# Altium footprint library SMotlaq-PCB_lib.PcbLib: 186 footprints (part 11 of 12)
Each footprint in its own frame and in the unit in brackets; x right, y up, seen from the top. Pads: shape width x height; smd on the part's side, far side on the other; paste and mask are expansions set on the pad; w line width, h text height; cw(c..) or ccw(c..) is an arc to the next point about the centre after c.
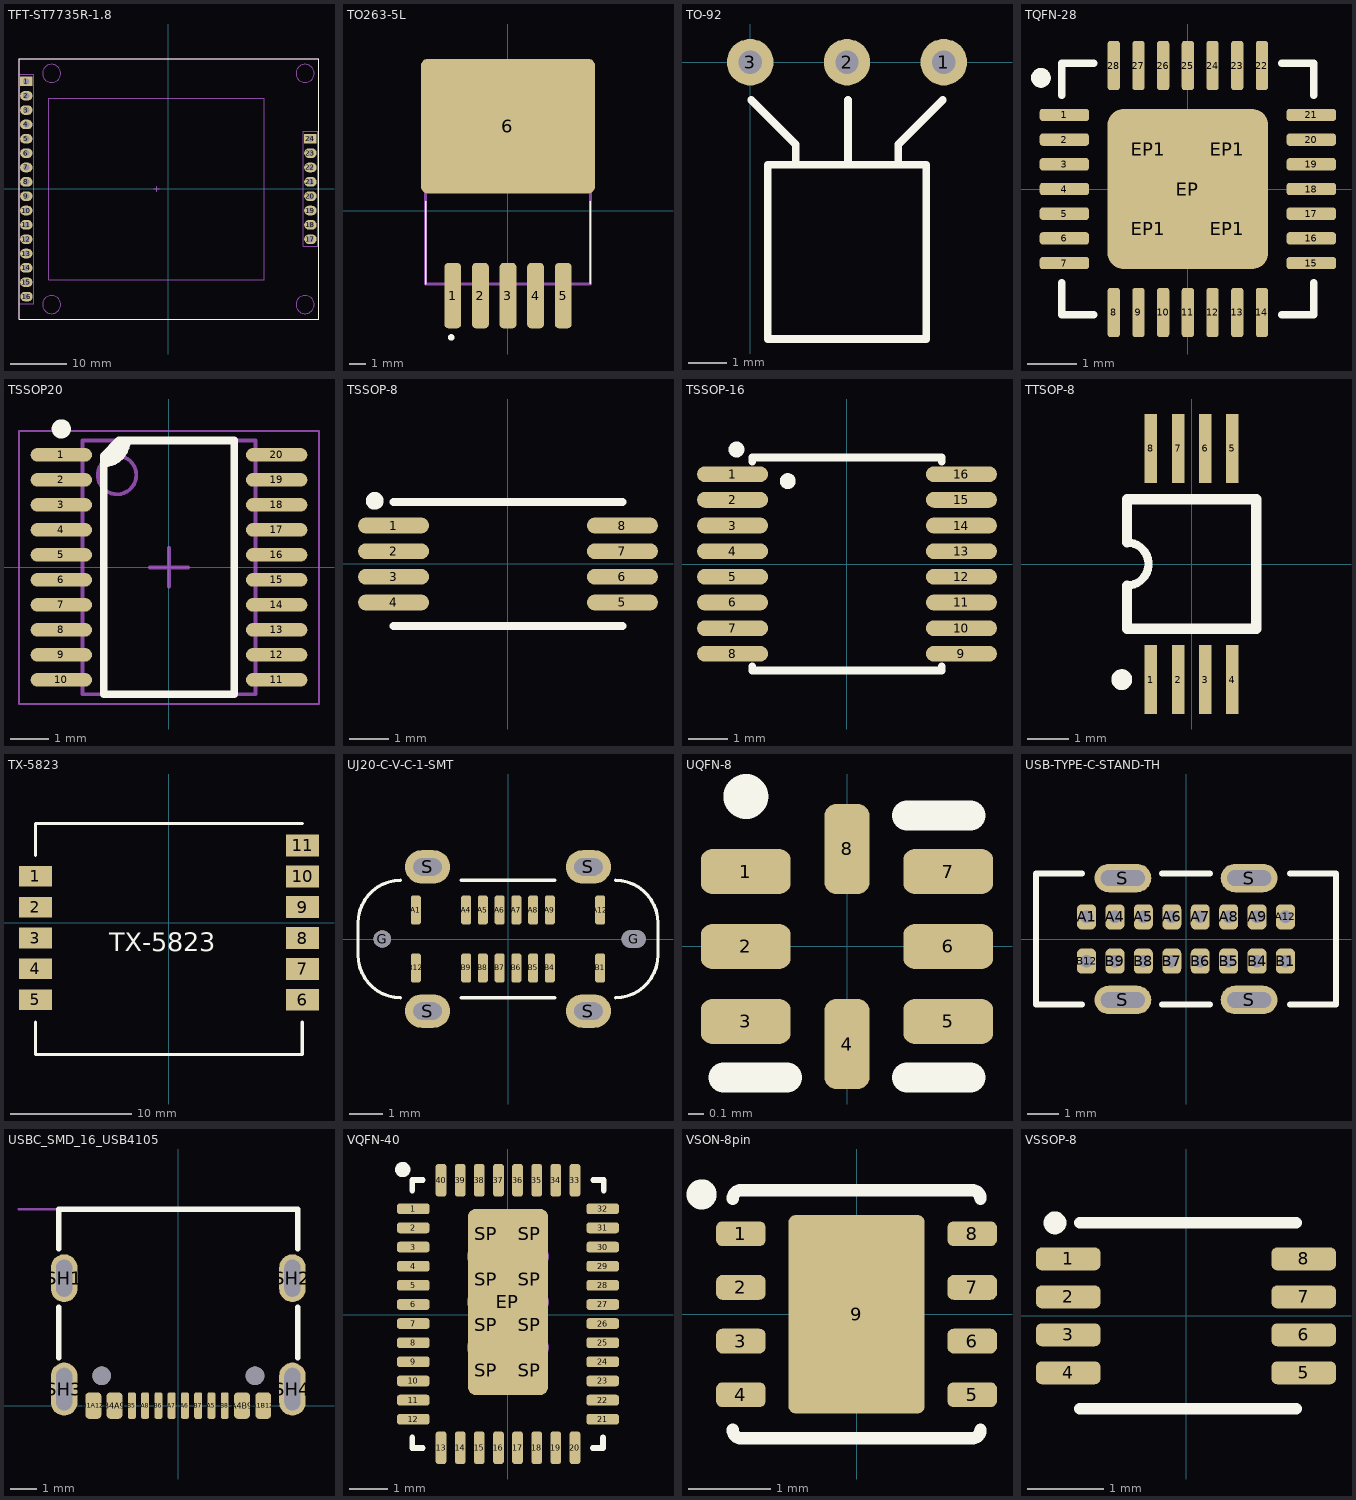
[diagram p10: the footprints below, top view; thin cyan lines are the x and y axes]

## TFT-ST7735R-1.8 [mm]
pads (24):
  rect 2.2x1.7 hole 1.1 paste-2539.97 mask+0: 1(-25.15,19.05) 24(25.15,8.89)
  oval 2.2x1.7 hole 1.1 paste-2539.97 mask+0: 2(-25.15,16.51) 3(-25.15,13.97) 4(-25.15,11.43) 5(-25.15,8.89) 6(-25.15,6.35) 7(-25.15,3.81) 8(-25.15,1.27) 9(-25.15,-1.27) 10(-25.15,-3.81) 11(-25.15,-6.35) 12(-25.15,-8.89) 13(-25.15,-11.43) 14(-25.15,-13.97) 15(-25.15,-16.51) 16(-25.117,-19.05) 17(25.15,-8.89) 18(25.15,-6.35) 19(25.15,-3.81) 20(25.15,-1.27) 21(25.15,1.27) 22(25.15,3.81) 23(25.15,6.35)
Top Overlay:
  lines w0.2: -26.45,-23.1 26.671,-23.1 26.671,23.1 -26.45,23.1 -26.45,-23.1
Mechanical 13:
  lines w0.2: -26.45,-20.35 -23.85,-20.35 -23.85,20.35 -26.45,20.35 -26.45,-20.35 ; 23.85,-10.16 26.45,-10.16 26.45,10.19 23.85,10.19 23.85,-10.16
Mechanical 15:
  circle w0.2: c-20.671,20.467 r1.6
  circle w0.2: c-20.671,-20.467 r1.6
  circle w0.2: c24.202,20.467 r1.6
  circle w0.2: c24.202,-20.467 r1.6
  lines w0.1: -2.591,0 -1.591,0 ; -2.091,-0.5 -2.091,0.5
  lines w0.2: -26.45,-23.1 -26.45,23.1 26.671,23.1 26.671,-23.1 -26.45,-23.1 ; -21.166,-16.053 -21.166,16.053 16.984,16.053 16.984,-16.053 -21.166,-16.053
Mechanical 16:
  lines w0.1: -2.591,0 -1.591,0 ; -2.091,-0.5 -2.091,0.5
3D body "1.8 LCD.stp": height 24.02, standoff 16.6, extent -26.409,-22.518 27.109,22.618
3D body "zl262-8s_p2-54_l20-8_w2-54_h8-5.stp": height 17, standoff 5.5, extent 23.86,-10.425 26.4,10.395
3D body "Header, Male, 2.54mm, 1x8.STEP": height 22.5, standoff 10.96, extent 23.86,-10.195 26.4,10.125
3D body "Header, Male, 2.54mm, 1x16.STEP": height 22.5, standoff 10.96, extent -26.42,-20.315 -23.88,20.325
3D body "Header Female 1x16.STEP": height 17.09, standoff 5.22, extent -26.387,-20.565 -23.912,20.225
3D body "Header Female 1x16.STEP": height 8.59, standoff -3.28, extent -26.387,-20.565 -23.912,20.225
3D body "zl262-8s_p2-54_l20-8_w2-54_h8-5.stp": height 8.5, standoff -3, extent 23.86,-10.425 26.4,10.395

## TO263-5L [mm]
pads (6):
  rrect50% 1.041x4.039 smd: 1(-3.404,-5.226) 2(-1.702,-5.226) 3(0,-5.226) 4(1.702,-5.226) 5(3.404,-5.226)
  rrect10% 10.744x8.306 smd paste-2539.97: 6(0,5.226)
Top Overlay:
  lines w0.1: -5.08,-4.509 -5.08,0.6 ; 5.08,-4.5 5.08,0.6
  lines w0.2: -3.6,-7.8 ccw(c-3.5,-7.8) -3.4,-7.8 ccw(c-3.5,-7.8) -3.6,-7.8
Top Paste:
  region: -4.5,2.426 -4.5,8.026 -4.5,8.072 -4.488,8.163 -4.464,8.251 -4.429,8.336 -4.383,8.416 -4.327,8.489 -4.263,8.553 -4.19,8.609 -4.11,8.655 -4.025,8.69 -3.937,8.714 -3.846,8.726 -3.8,8.726 3.8,8.726 3.846,8.726 3.937,8.714 4.025,8.69 4.11,8.655 4.19,8.609 4.263,8.553 4.327,8.489 4.383,8.416 4.429,8.336 4.464,8.251 4.488,8.163 4.5,8.072 4.5,8.026 4.5,2.426 4.5,2.38 4.488,2.289 4.464,2.201 4.429,2.116 4.383,2.036 4.327,1.963 4.263,1.899 4.19,1.843 4.11,1.797 4.025,1.762 3.937,1.738 3.846,1.726 3.8,1.726 -3.8,1.726 -3.846,1.726 -3.937,1.738 -4.025,1.762 -4.11,1.797 -4.19,1.843 -4.263,1.899 -4.327,1.963 -4.383,2.036 -4.429,2.116 -4.464,2.201 -4.488,2.289 -4.5,2.38
Mechanical 13:
  lines w0.2: -5.08,-4.509 5.08,-4.509 5.08,4.509 -5.08,4.509 -5.08,-4.509
3D body "User Library-MIC29302WU.step": height 4.45, standoff -0.1, extent -5.15,-6.476 5.15,8.752

## TO-92 [mm]
pads (3):
  round 1.2 hole 0.6: 1(5,0) 2(2.5,0) 3(0,0)
Top Overlay:
  lines w0.2: 0.025,-0.975 1.175,-2.125 1.175,-2.65 ; 2.525,-2.65 2.525,-0.975 ; 3.825,-2.65 3.825,-2.125 4.975,-0.975 ; 0.45,-7.15 4.55,-7.15 4.55,-2.65 0.45,-2.65 0.45,-7.15
3D body "User Library-TO-92-katowy.step": height 3.8, standoff -1.7, extent -0.346,-7.2 5.346,0.303

## TQFN-28 [mm]
pads (33):
  rrect50% 1x0.25 smd mask+0.1: 1(-2.5,1.5) 2(-2.5,1) 3(-2.5,0.5) 4(-2.5,0) 5(-2.5,-0.5) 6(-2.5,-1) 7(-2.5,-1.5) 15(2.5,-1.5) 16(2.5,-1) 17(2.5,-0.5) 18(2.5,0) 19(2.5,0.5) 20(2.5,1) 21(2.5,1.5)
  rrect50% 0.25x1 smd mask+0.1: 8(-1.5,-2.5) 9(-1,-2.5) 10(-0.5,-2.5) 11(0,-2.5) 12(0.5,-2.5) 13(1,-2.5) 14(1.5,-2.5) 22(1.5,2.5) 23(1,2.5) 24(0.5,2.5) 25(0,2.5) 26(-0.5,2.5) 27(-1,2.5) 28(-1.5,2.5)
  rrect20% 3.25x3.25 smd paste-2539.97 mask+0.1: EP(0,0)
  rrect20% 1.2x1.2 on Top Paste mask+0.1: EP1(-0.8,-0.8) EP1(-0.8,0.8) EP1(0.8,-0.8) EP1(0.8,0.8)
Top Overlay:
  circle w0.2: c-2.975,2.25 r0.1
  lines w0.15: -2.55,-1.9 -2.55,-2.55 -1.9,-2.55 ; -2.55,1.9 -2.55,2.55 -1.9,2.55 ; 1.9,-2.55 2.55,-2.55 2.55,-1.9 ; 1.9,2.55 2.55,2.55 2.55,1.9
3D body "MAX11131ATI+.stp": height 0.8, standoff 0, extent -2.55,-2.55 2.55,2.55

## TSSOP20 [mm]
pads (20):
  oval 1.6x0.35 smd: 1(-2.8,2.918) 2(-2.8,2.268) 3(-2.8,1.618) 4(-2.8,0.968) 5(-2.8,0.318) 6(-2.8,-0.332) 7(-2.8,-0.982) 8(-2.8,-1.632) 9(-2.8,-2.282) 10(-2.8,-2.932) 11(2.8,-2.932) 12(2.8,-2.282) 13(2.8,-1.632) 14(2.8,-0.982) 15(2.8,-0.332) 16(2.8,0.318) 17(2.8,0.968) 18(2.8,1.618) 19(2.8,2.268) 20(2.8,2.918)
Top Overlay:
  circle w0.25: c-2.8,3.593 r0.125
  region: -1.7,2.693 -1.581,2.693 -1.36,2.785 -1.191,2.954 -1.1,3.174 -1.1,3.293 -1.4,3.293 -1.7,2.993
  lines w0.2: -1.7,2.693 ccw(c-1.7,3.293) -1.1,3.293 ; -1.7,-3.307 1.7,-3.307 1.7,3.293 -1.3,3.293 -1.7,2.893 -1.7,-3.307
Mechanical 13:
  circle w0.1: c-1.35,2.393 r0.5
  lines w0.1: -2.25,-3.307 2.25,-3.307 2.25,3.293 -2.25,3.293 -2.25,-3.307
Mechanical 15:
  lines w0.05: -3.9,-3.557 3.9,-3.557 3.9,3.543 -3.9,3.543 -3.9,-3.557
  lines w0.1: -0.5,-0.007 0.5,-0.007 ; 0,-0.507 0,0.493
3D body "TSSOP-20-TI-PW.STEP": height 1.2, standoff 0, extent -3.21,-3.257 3.211,3.243

## TSSOP-8 [mm]
pads (8):
  oval 1.8x0.4 smd mask+0.075: 1(-2.9,0.975) 2(-2.9,0.325) 3(-2.9,-0.325) 4(-2.9,-0.975) 5(2.9,-0.975) 6(2.9,-0.325) 7(2.9,0.325) 8(2.9,0.975)
Top Overlay:
  circle w0.25: c-3.375,1.6 r0.1
  lines w0.2: -2.9,-1.575 2.9,-1.575 ; -2.9,1.575 2.9,1.575
3D body "User Library-TSS0P8.step": height 1.09, standoff 0, extent -3.14,-1.575 3.14,1.425

## TSSOP-16 [mm]
pads (16):
  oval 1.8x0.4 smd mask+0.075: 1(-2.9,2.275) 2(-2.9,1.625) 3(-2.9,0.975) 4(-2.9,0.325) 5(-2.9,-0.325) 6(-2.9,-0.975) 7(-2.9,-1.625) 8(-2.9,-2.275) 9(2.9,-2.275) 10(2.9,-1.625) 11(2.9,-0.975) 12(2.9,-0.325) 13(2.9,0.325) 14(2.9,0.975) 15(2.9,1.625) 16(2.9,2.275)
Top Overlay:
  circle w0.2: c-2.8,2.9 r0.1
  circle w0.2: c-1.5,2.1 r0.1
  lines w0.2: -2.4,-2.6 -2.4,-2.7 2.4,-2.7 2.4,-2.6 ; -2.4,2.6 -2.4,2.7 2.4,2.7 2.4,2.6
3D body "User Library-TSSOP-16-1.step": height 1.1, standoff 0, extent -3.2,-2.5 3.2,2.5

## TTSOP-8 [mm]
pads (8):
  rect 0.3x1.65 smd: 1(-0.975,-2.775) 2(-0.325,-2.775) 3(0.325,-2.775) 4(0.975,-2.775) 5(0.975,2.775) 6(0.325,2.775) 7(-0.325,2.775) 8(-0.975,2.775)
Top Overlay:
  circle w0.25: c-1.675,-2.775 r0.125
  lines w0.2: -1.55,-0.517 ccw(c-1.55,0) -1.55,0.517
  lines w0.25: -1.55,-0.517 -1.55,-1.55 1.55,-1.55 1.55,1.55 -1.55,1.55 -1.55,0.517
3D body "User Library-TSS0P8.step": height 1.09, standoff 0, extent -1.424,-3.14 1.576,3.14

## TX-5823 [mm]
pads (11):
  rect 2.7x1.7 smd: 1(-11,3.81) 2(-11,1.27) 3(-11,-1.27) 4(-11,-3.81) 5(-11,-6.35)
  rect 2.7x1.8 smd: 6(11,-6.35) 7(11,-3.81) 8(11,-1.27) 9(11,1.27) 10(11,3.81) 11(11,6.35)
Top Overlay:
  lines w0.254: -11,-8.183 -11,-10.85 10.971,-10.85 10.971,-8.183 ; -11,5.533 -11,8.15 11,8.15
  text "TX-5823" at -4.904,-2.341 h1.52
3D body "dummy_tx5823.stp": height 3.23, standoff -0.1, extent -10.906,-10.9 10.844,8.25

## UJ20-C-V-C-1-SMT [mm]
height 6.5
pads (22):
  rrect50% 0.3x0.87 smd: A1(-2.75,0.865) A4(-1.25,0.865) A5(-0.75,0.865) A6(-0.25,0.865) A7(0.25,0.865) A8(0.75,0.865) A9(1.25,0.865) A12(2.75,0.865) B1(2.75,-0.865) B4(1.25,-0.865) B5(0.75,-0.865) B6(0.25,-0.865) B7(-0.25,-0.865) B8(-0.75,-0.865) B9(-1.25,-0.865) B12(-2.75,-0.865)
  round 0.52 hole 0.52 unplated: G(-3.75,0)
  oval 0.72x0.52 hole 0.52 slot 0.72 at 0 deg unplated: G(3.75,0)
  oval 1.35x1 hole 0.52 slot 0.85 at 0 deg: S(-2.4,-2.15) S(-2.4,2.15) S(2.4,-2.15) S(2.4,2.15)
Top Overlay:
  lines w0.1: -3.205,-1.75 cw(c-3.205,-0.48) -4.475,-0.48 -4.475,0.48 cw(c-3.205,0.48) -3.205,1.75 ; -1.4,-1.75 1.4,-1.75 ; -1.4,1.75 1.4,1.75 ; 3.205,-1.75 ccw(c3.205,-0.48) 4.475,-0.48 4.475,0.48 ccw(c3.205,0.48) 3.205,1.75
3D body "UJ20-C-V-C-1-SMT-TR.stp": height 6.5, standoff -0.95, extent -4.47,-2.3 4.47,2.3

## UQFN-8 [mm]
pads (8):
  rrect50% 0.6x0.3 smd: 1(-0.675,0.5) 2(-0.675,0) 3(-0.675,-0.5) 5(0.675,-0.5) 6(0.675,0) 7(0.675,0.5)
  rrect50% 0.3x0.6 smd: 4(0,-0.65) 8(0,0.65)
Top Overlay:
  circle w0.2: c-0.675,1 r0.05
  lines w0.2: -0.825,-0.875 -0.4,-0.875 ; 0.4,-0.875 0.825,-0.875 ; 0.4,0.875 0.825,0.875
3D body "User Library-qfn8_1-5q.STEP": height 0.6, standoff 0, extent -0.75,-0.75 0.75,0.75

## USB-TYPE-C-STAND-TH [mm] "16PLC-H10.0"
height 10
pads (20):
  rrect50% 0.6x0.8 hole 0.4: A1(-3.15,0.7) A4(-2.25,0.7) A5(-1.35,0.7) A6(-0.45,0.7) A7(0.45,0.7) A8(1.35,0.7) A9(2.25,0.7) A12(3.15,0.7) B1(3.15,-0.7) B4(2.25,-0.7) B5(1.35,-0.7) B6(0.45,-0.7) B7(-0.45,-0.7) B8(-1.35,-0.7) B9(-2.25,-0.7) B12(-3.15,-0.7)
  rrect100% 1.8x0.9 hole 0.5 slot 1.4 at 0 deg: S(-2,-1.93) S(-2,1.93) S(2,-1.93) S(2,1.93)
Top Overlay:
  lines w0.2: -3.3,-2.075 -4.75,-2.075 -4.75,2.075 -3.3,2.075 ; -0.75,-2.075 0.75,-2.075 ; -0.75,2.075 0.75,2.075 ; 3.3,-2.075 4.75,-2.075 4.75,2.075 3.3,2.075
3D body "UJ20-C-V-C-2-SMT-TR.stp": height 9.99, standoff -2.05, extent -4.75,-2.08 4.75,2.08

## USBC_SMD_16_USB4105 [mm] "CONN, USB, Type C, USB4105, popular*"
height 3.31
pads (18):
  rrect50% 0.6x1 smd mask+0.075: A1B12(3.2,0) A4B9(2.4,0) B1A12(-3.2,0) B4A9(-2.4,0)
  rrect50% 0.3x1 smd mask+0.075: A5(1.25,0) A6(0.25,0) A7(-0.25,0) A8(-1.25,0) B5(-1.75,0) B6(-0.75,0) B7(0.75,0) B8(1.75,0)
  oval 1x1.8 hole 0.6 slot 1.4 at 90 deg: SH1(-4.3,4.8) SH2(4.3,4.8)
  oval 1x2 hole 0.6 slot 1.6 at 90 deg: SH3(-4.3,0.62) SH4(4.3,0.62)
  round 0.7 hole 0.7 unplated: ""(-2.89,1.12) ""(2.89,1.12)
Top Overlay:
  lines w0.2: -4.5,1.8 -4.5,3.7 ; -4.5,5.9 -4.5,7.4 4.5,7.4 4.5,5.9 ; 4.5,1.8 4.5,3.7
Mechanical 13:
  lines w0.1: -6,7.4 -4,7.4
  text "PCB EDGE" at -6,7.8 h0.8
3D body "USB4105-15-A.stp": height 3.26, standoff -0.9, extent -4.79,-0.3 4.79,7.408

## VQFN-40 [mm]
pads (49):
  rrect50% 0.85x0.28 smd mask+0.05: 1(-2.475,2.775) 2(-2.475,2.275) 3(-2.475,1.775) 4(-2.475,1.275) 5(-2.475,0.775) 6(-2.475,0.275) 7(-2.475,-0.225) 8(-2.475,-0.725) 9(-2.475,-1.225) 10(-2.475,-1.725) 11(-2.475,-2.225) 12(-2.475,-2.725) 21(2.475,-2.725) 22(2.475,-2.225) 23(2.475,-1.725) 24(2.475,-1.225) 25(2.475,-0.725) 26(2.475,-0.225) 27(2.475,0.275) 28(2.475,0.775) 29(2.475,1.275) 30(2.475,1.775) 31(2.475,2.275) 32(2.475,2.775)
  rrect50% 0.28x0.85 smd mask+0.05: 13(-1.75,-3.47) 14(-1.25,-3.47) 15(-0.75,-3.47) 16(-0.25,-3.47) 17(0.25,-3.47) 18(0.75,-3.47) 19(1.25,-3.47) 20(1.75,-3.47) 33(1.75,3.52) 34(1.25,3.52) 35(0.75,3.52) 36(0.25,3.52) 37(-0.25,3.52) 38(-0.75,3.52) 39(-1.25,3.52) 40(-1.75,3.52)
  rrect20% 2.1x4.87 smd paste-2539.97 mask+0.05: EP(0,0.34)
  rrect10% 0.94x0.99 on Top Paste mask+0.1: SP(-0.57,-1.445) SP(-0.57,-0.255) SP(-0.57,0.935) SP(-0.57,2.125) SP(0.57,-1.445) SP(0.57,-0.255) SP(0.57,0.935) SP(0.57,2.125)
Top Overlay:
  circle w0.2: c-2.75,3.8 r0.1
  lines w0.15: -2.5,-3.2 -2.5,-3.475 -2.225,-3.475 ; -2.5,3.25 -2.5,3.525 -2.225,3.525 ; 2.217,-3.475 2.48,-3.475 2.48,-3.2 ; 2.225,3.525 2.5,3.525 2.5,3.25
Mechanical 1:
  circle w0.15: c0,0.34 r0.2
  circle w0.15: c0,1.53 r0.2
  circle w0.15: c0,2.48 r0.2
  circle w0.15: c0,-0.85 r0.2
  circle w0.15: c0,-1.8 r0.2
  circle w0.15: c0.8,0.34 r0.2
  circle w0.15: c0.8,1.53 r0.2
  circle w0.15: c0.8,-0.85 r0.2
  circle w0.15: c-0.8,-0.85 r0.2
  circle w0.15: c-0.8,0.34 r0.2
  circle w0.15: c-0.8,1.53 r0.2
3D body "VQFN-40.STEP": height 1, standoff 0, extent -2.5,-3.475 2.5,3.525

## VSON-8pin [mm]
pads (9):
  rrect50% 0.6x0.3 smd: 1(-1.4,0.975) 2(-1.4,0.325) 3(-1.4,-0.325) 4(-1.4,-0.975) 5(1.4,-0.975) 6(1.4,-0.325) 7(1.4,0.325) 8(1.4,0.975)
  rrect10% 1.65x2.4 smd paste-0.3: 9(0,0)
Top Overlay:
  circle w0.254: c-1.875,1.45 r0.056
  lines w0.15: -1.5,-1.4 ccw(c-1.4,-1.4) -1.4,-1.5 1.4,-1.5 ccw(c1.4,-1.4) 1.5,-1.4 ; -1.5,1.4 cw(c-1.4,1.4) -1.4,1.5 1.4,1.5 cw(c1.4,1.4) 1.5,1.4
3D body "User Library-VSON_8_3x3_e0p65.step": height 1, standoff 0, extent -1.5,-1.5 1.5,1.5

## VSSOP-8 [mm]
height 0.9
pads (8):
  rrect50% 0.85x0.3 smd: 1(-1.55,0.75) 2(-1.55,0.25) 3(-1.55,-0.25) 4(-1.55,-0.75) 5(1.55,-0.75) 6(1.55,-0.25) 7(1.55,0.25) 8(1.55,0.75)
Top Overlay:
  lines w0.15: -1.4,-1.225 1.45,-1.225 ; -1.4,1.225 1.45,1.225
  lines w0.2: -1.676,1.235 ccw(c-1.725,1.225) -1.675,1.225
3D body "User Library-SOP50P310X90-8N[8US8_VSSOP_DCU_MO-187CA].step": height 0.9, standoff 0, extent -1.6,-1.05 1.6,1.05